# Altium integrated library Weidmueller_OMNIMATE_Signal.IntLib: 2550 symbols (part 30 of 45) (continued)
## 1864130000 (continued)
OMNIMATE Signal - series BC/SC 3.81; PartNumber: 1864130000; Manufacturer: Weidmueller; Short_text_for_material: SC-SMT 3.81/08/180LF 1.5SN BK BX; Side_termination_characteristic: Solder flange; Mounting_onto_the_PCB: Reflow solder connection; Pitch_mm: 3.81 mm; Pitch_inch: 0.15 inch; No_of_poles: 8; Outgoing_elbow: 180°; Solder_pin_length_mm: 1.5 mm; Contact_surface: tinned; Insulating_material: LCP GF; UL_94_flammability_rating: V-0; Rated_voltage_for_surge_voltage_class_pollution_degree_II_2: 320 V; Rated_current_min_no_of_poles_TU_20_deg_C: 17.5 A; Rated_voltage_use_group_B_UL_1059: 300 V; Rated_current_use_group_B_UL_1059: 10 A; PackageReference: SC_SMT_3_81_180LF_08; Colour: Black; Packaging: Box; Qty: 50 PCS; Revision: V1; ComponentLink1Description: Manufacturer URL; ComponentLink1URL: http://www.weidmueller.com/; ComponentLink2Description: URL Link1; ComponentLink2URL: http://catalog.weidmueller.com/catalog/Start.do?localeId=en&ObjectID=1864130000
footprint SC_SMT_3_81_180LF_08 (OMNIMATE Signal - Serie BC/SC 3.81  SC-SMT 3.81/08/180LF 3.2)
pins: A1, A2, A3, A4, A5, A6, A7, A8

## 1864130000_Single
designator J?
OMNIMATE Signal - series BC/SC 3.81; PartNumber: 1864130000; Manufacturer: Weidmueller; Short_text_for_material: SC-SMT 3.81/08/180LF 1.5SN BK BX; Side_termination_characteristic: Solder flange; Mounting_onto_the_PCB: Reflow solder connection; Pitch_mm: 3.81 mm; Pitch_inch: 0.15 inch; No_of_poles: 8; Outgoing_elbow: 180°; Solder_pin_length_mm: 1.5 mm; Contact_surface: tinned; Insulating_material: LCP GF; UL_94_flammability_rating: V-0; Rated_voltage_for_surge_voltage_class_pollution_degree_II_2: 320 V; Rated_current_min_no_of_poles_TU_20_deg_C: 17.5 A; Rated_voltage_use_group_B_UL_1059: 300 V; Rated_current_use_group_B_UL_1059: 10 A; PackageReference: SC_SMT_3_81_180LF_08; Colour: Black; Packaging: Box; Qty: 50 PCS; Revision: V1; ComponentLink1Description: Manufacturer URL; ComponentLink1URL: http://www.weidmueller.com/; ComponentLink2Description: URL Link1; ComponentLink2URL: http://catalog.weidmueller.com/catalog/Start.do?localeId=en&ObjectID=1864130000
footprint SC_SMT_3_81_180LF_08 (OMNIMATE Signal - Serie BC/SC 3.81  SC-SMT 3.81/08/180LF 3.2)
part A pins: A1
part B pins: A2
part C pins: A3
part D pins: A4
part E pins: A5
part F pins: A6
part G pins: A7
part H pins: A8

## 1864220000
designator J?
OMNIMATE Signal - series BC/SC 3.81; PartNumber: 1864220000; Manufacturer: Weidmueller; Short_text_for_material: SC-SMT 3.81/02/180LF 1.5SN BK RL; Side_termination_characteristic: Solder flange; Mounting_onto_the_PCB: Reflow solder connection; Pitch_mm: 3.81 mm; Pitch_inch: 0.15 inch; No_of_poles: 2; Outgoing_elbow: 180°; Solder_pin_length_mm: 1.5 mm; Contact_surface: tinned; Insulating_material: LCP GF; UL_94_flammability_rating: V-0; Rated_voltage_for_surge_voltage_class_pollution_degree_II_2: 320 V; Rated_current_min_no_of_poles_TU_20_deg_C: 17.5 A; Rated_voltage_use_group_B_UL_1059: 300 V; Rated_current_use_group_B_UL_1059: 10 A; PackageReference: SC_SMT_3_81_180LF_02; Colour: Black; Packaging: Tape; Qty: 300 PCS; Revision: V1; ComponentLink1Description: Manufacturer URL; ComponentLink1URL: http://www.weidmueller.com/; ComponentLink2Description: URL Link1; ComponentLink2URL: http://catalog.weidmueller.com/catalog/Start.do?localeId=en&ObjectID=1864220000
footprint SC_SMT_3_81_180LF_02 (OMNIMATE Signal - Serie BC/SC 3.81  SC-SMT 3.81/02/180LF 3.2)
pins: A1, A2

## 1864220000_Single
designator J?
OMNIMATE Signal - series BC/SC 3.81; PartNumber: 1864220000; Manufacturer: Weidmueller; Short_text_for_material: SC-SMT 3.81/02/180LF 1.5SN BK RL; Side_termination_characteristic: Solder flange; Mounting_onto_the_PCB: Reflow solder connection; Pitch_mm: 3.81 mm; Pitch_inch: 0.15 inch; No_of_poles: 2; Outgoing_elbow: 180°; Solder_pin_length_mm: 1.5 mm; Contact_surface: tinned; Insulating_material: LCP GF; UL_94_flammability_rating: V-0; Rated_voltage_for_surge_voltage_class_pollution_degree_II_2: 320 V; Rated_current_min_no_of_poles_TU_20_deg_C: 17.5 A; Rated_voltage_use_group_B_UL_1059: 300 V; Rated_current_use_group_B_UL_1059: 10 A; PackageReference: SC_SMT_3_81_180LF_02; Colour: Black; Packaging: Tape; Qty: 300 PCS; Revision: V1; ComponentLink1Description: Manufacturer URL; ComponentLink1URL: http://www.weidmueller.com/; ComponentLink2Description: URL Link1; ComponentLink2URL: http://catalog.weidmueller.com/catalog/Start.do?localeId=en&ObjectID=1864220000
footprint SC_SMT_3_81_180LF_02 (OMNIMATE Signal - Serie BC/SC 3.81  SC-SMT 3.81/02/180LF 3.2)
part A pins: A1
part B pins: A2

## 1864230000
designator J?
OMNIMATE Signal - series BC/SC 3.81; PartNumber: 1864230000; Manufacturer: Weidmueller; Short_text_for_material: SC-SMT 3.81/03/180LF 1.5SN BK RL; Side_termination_characteristic: Solder flange; Mounting_onto_the_PCB: Reflow solder connection; Pitch_mm: 3.81 mm; Pitch_inch: 0.15 inch; No_of_poles: 3; Outgoing_elbow: 180°; Solder_pin_length_mm: 1.5 mm; Contact_surface: tinned; Insulating_material: LCP GF; UL_94_flammability_rating: V-0; Rated_voltage_for_surge_voltage_class_pollution_degree_II_2: 320 V; Rated_current_min_no_of_poles_TU_20_deg_C: 17.5 A; Rated_voltage_use_group_B_UL_1059: 300 V; Rated_current_use_group_B_UL_1059: 10 A; PackageReference: SC_SMT_3_81_180LF_03; Colour: Black; Packaging: Tape; Qty: 300 PCS; Revision: V1; ComponentLink1Description: Manufacturer URL; ComponentLink1URL: http://www.weidmueller.com/; ComponentLink2Description: URL Link1; ComponentLink2URL: http://catalog.weidmueller.com/catalog/Start.do?localeId=en&ObjectID=1864230000
footprint SC_SMT_3_81_180LF_03 (OMNIMATE Signal - Serie BC/SC 3.81  SC-SMT 3.81/03/180LF 3.2)
pins: A1, A2, A3

## 1864230000_Single
designator J?
OMNIMATE Signal - series BC/SC 3.81; PartNumber: 1864230000; Manufacturer: Weidmueller; Short_text_for_material: SC-SMT 3.81/03/180LF 1.5SN BK RL; Side_termination_characteristic: Solder flange; Mounting_onto_the_PCB: Reflow solder connection; Pitch_mm: 3.81 mm; Pitch_inch: 0.15 inch; No_of_poles: 3; Outgoing_elbow: 180°; Solder_pin_length_mm: 1.5 mm; Contact_surface: tinned; Insulating_material: LCP GF; UL_94_flammability_rating: V-0; Rated_voltage_for_surge_voltage_class_pollution_degree_II_2: 320 V; Rated_current_min_no_of_poles_TU_20_deg_C: 17.5 A; Rated_voltage_use_group_B_UL_1059: 300 V; Rated_current_use_group_B_UL_1059: 10 A; PackageReference: SC_SMT_3_81_180LF_03; Colour: Black; Packaging: Tape; Qty: 300 PCS; Revision: V1; ComponentLink1Description: Manufacturer URL; ComponentLink1URL: http://www.weidmueller.com/; ComponentLink2Description: URL Link1; ComponentLink2URL: http://catalog.weidmueller.com/catalog/Start.do?localeId=en&ObjectID=1864230000
footprint SC_SMT_3_81_180LF_03 (OMNIMATE Signal - Serie BC/SC 3.81  SC-SMT 3.81/03/180LF 3.2)
part A pins: A1
part B pins: A2
part C pins: A3

## 1864240000
designator J?
OMNIMATE Signal - series BC/SC 3.81; PartNumber: 1864240000; Manufacturer: Weidmueller; Short_text_for_material: SC-SMT 3.81/04/180LF 1.5SN BK RL; Side_termination_characteristic: Solder flange; Mounting_onto_the_PCB: Reflow solder connection; Pitch_mm: 3.81 mm; Pitch_inch: 0.15 inch; No_of_poles: 4; Outgoing_elbow: 180°; Solder_pin_length_mm: 1.5 mm; Contact_surface: tinned; Insulating_material: LCP GF; UL_94_flammability_rating: V-0; Rated_voltage_for_surge_voltage_class_pollution_degree_II_2: 320 V; Rated_current_min_no_of_poles_TU_20_deg_C: 17.5 A; Rated_voltage_use_group_B_UL_1059: 300 V; Rated_current_use_group_B_UL_1059: 10 A; PackageReference: SC_SMT_3_81_180LF_04; Colour: Black; Packaging: Tape; Qty: 300 PCS; Revision: V1; ComponentLink1Description: Manufacturer URL; ComponentLink1URL: http://www.weidmueller.com/; ComponentLink2Description: URL Link1; ComponentLink2URL: http://catalog.weidmueller.com/catalog/Start.do?localeId=en&ObjectID=1864240000
footprint SC_SMT_3_81_180LF_04 (OMNIMATE Signal - Serie BC/SC 3.81  SC-SMT 3.81/04/180LF 3.2)
pins: A1, A2, A3, A4

## 1864240000_Single
designator J?
OMNIMATE Signal - series BC/SC 3.81; PartNumber: 1864240000; Manufacturer: Weidmueller; Short_text_for_material: SC-SMT 3.81/04/180LF 1.5SN BK RL; Side_termination_characteristic: Solder flange; Mounting_onto_the_PCB: Reflow solder connection; Pitch_mm: 3.81 mm; Pitch_inch: 0.15 inch; No_of_poles: 4; Outgoing_elbow: 180°; Solder_pin_length_mm: 1.5 mm; Contact_surface: tinned; Insulating_material: LCP GF; UL_94_flammability_rating: V-0; Rated_voltage_for_surge_voltage_class_pollution_degree_II_2: 320 V; Rated_current_min_no_of_poles_TU_20_deg_C: 17.5 A; Rated_voltage_use_group_B_UL_1059: 300 V; Rated_current_use_group_B_UL_1059: 10 A; PackageReference: SC_SMT_3_81_180LF_04; Colour: Black; Packaging: Tape; Qty: 300 PCS; Revision: V1; ComponentLink1Description: Manufacturer URL; ComponentLink1URL: http://www.weidmueller.com/; ComponentLink2Description: URL Link1; ComponentLink2URL: http://catalog.weidmueller.com/catalog/Start.do?localeId=en&ObjectID=1864240000
footprint SC_SMT_3_81_180LF_04 (OMNIMATE Signal - Serie BC/SC 3.81  SC-SMT 3.81/04/180LF 3.2)
part A pins: A1
part B pins: A2
part C pins: A3
part D pins: A4

## 1864280000
designator J?
OMNIMATE Signal - series BC/SC 3.81; PartNumber: 1864280000; Manufacturer: Weidmueller; Short_text_for_material: SC-SMT 3.81/08/180LF 1.5SN BK RL; Side_termination_characteristic: Solder flange; Mounting_onto_the_PCB: Reflow solder connection; Pitch_mm: 3.81 mm; Pitch_inch: 0.15 inch; No_of_poles: 8; Outgoing_elbow: 180°; Solder_pin_length_mm: 1.5 mm; Contact_surface: tinned; Insulating_material: LCP GF; UL_94_flammability_rating: V-0; Rated_voltage_for_surge_voltage_class_pollution_degree_II_2: 320 V; Rated_current_min_no_of_poles_TU_20_deg_C: 17.5 A; Rated_voltage_use_group_B_UL_1059: 300 V; Rated_current_use_group_B_UL_1059: 10 A; PackageReference: SC_SMT_3_81_180LF_08; Colour: Black; Packaging: Tape; Qty: 300 PCS; Revision: V1; ComponentLink1Description: Manufacturer URL; ComponentLink1URL: http://www.weidmueller.com/; ComponentLink2Description: URL Link1; ComponentLink2URL: http://catalog.weidmueller.com/catalog/Start.do?localeId=en&ObjectID=1864280000
footprint SC_SMT_3_81_180LF_08 (OMNIMATE Signal - Serie BC/SC 3.81  SC-SMT 3.81/08/180LF 3.2)
pins: A1, A2, A3, A4, A5, A6, A7, A8

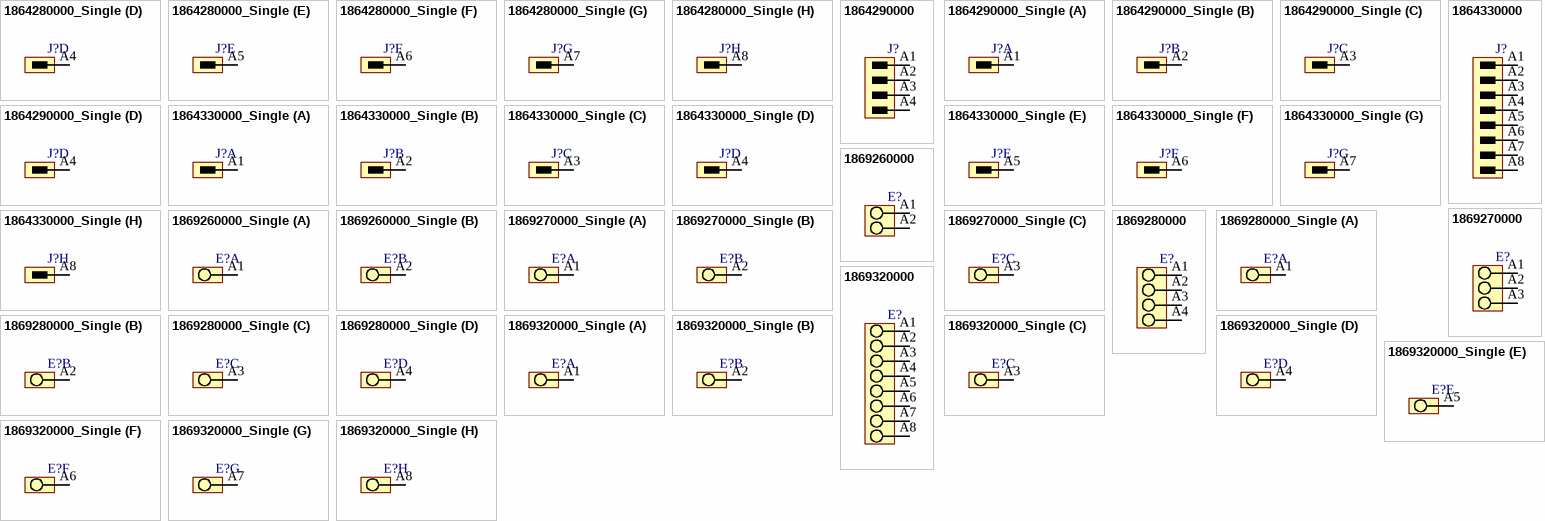
[diagram p151: symbols 1864280000_Single to 1869320000_Single]

## 1864280000_Single
designator J?
OMNIMATE Signal - series BC/SC 3.81; PartNumber: 1864280000; Manufacturer: Weidmueller; Short_text_for_material: SC-SMT 3.81/08/180LF 1.5SN BK RL; Side_termination_characteristic: Solder flange; Mounting_onto_the_PCB: Reflow solder connection; Pitch_mm: 3.81 mm; Pitch_inch: 0.15 inch; No_of_poles: 8; Outgoing_elbow: 180°; Solder_pin_length_mm: 1.5 mm; Contact_surface: tinned; Insulating_material: LCP GF; UL_94_flammability_rating: V-0; Rated_voltage_for_surge_voltage_class_pollution_degree_II_2: 320 V; Rated_current_min_no_of_poles_TU_20_deg_C: 17.5 A; Rated_voltage_use_group_B_UL_1059: 300 V; Rated_current_use_group_B_UL_1059: 10 A; PackageReference: SC_SMT_3_81_180LF_08; Colour: Black; Packaging: Tape; Qty: 300 PCS; Revision: V1; ComponentLink1Description: Manufacturer URL; ComponentLink1URL: http://www.weidmueller.com/; ComponentLink2Description: URL Link1; ComponentLink2URL: http://catalog.weidmueller.com/catalog/Start.do?localeId=en&ObjectID=1864280000
footprint SC_SMT_3_81_180LF_08 (OMNIMATE Signal - Serie BC/SC 3.81  SC-SMT 3.81/08/180LF 3.2)
part A pins: A1
part B pins: A2
part C pins: A3
part D pins: A4
part E pins: A5
part F pins: A6
part G pins: A7
part H pins: A8

## 1864290000
designator J?
OMNIMATE Signal - series BC/SC 3.81; PartNumber: 1864290000; Manufacturer: Weidmueller; Short_text_for_material: SC-SMT 3.81/04/180G 1.5SN BK RL; Side_termination_characteristic: closed side; Mounting_onto_the_PCB: Reflow solder connection; Pitch_mm: 3.81 mm; Pitch_inch: 0.15 inch; No_of_poles: 4; Outgoing_elbow: 180°; Solder_pin_length_mm: 1.5 mm; Contact_surface: tinned; Insulating_material: LCP GF; UL_94_flammability_rating: V-0; Rated_voltage_for_surge_voltage_class_pollution_degree_II_2: 320 V; Rated_current_min_no_of_poles_TU_20_deg_C: 17.5 A; Rated_voltage_use_group_B_UL_1059: 300 V; Rated_current_use_group_B_UL_1059: 10 A; PackageReference: SC_SMT_3_81_180G_04; Colour: Black; Packaging: Tape; Qty: 300 PCS; Revision: V1; ComponentLink1Description: Manufacturer URL; ComponentLink1URL: http://www.weidmueller.com/; ComponentLink2Description: URL Link1; ComponentLink2URL: http://catalog.weidmueller.com/catalog/Start.do?localeId=en&ObjectID=1864290000
footprint SC_SMT_3_81_180G_04 (OMNIMATE Signal - Serie BC/SC 3.81  SC-SMT 3.81/04/180G 3.2)
pins: A1, A2, A3, A4

## 1864290000_Single
designator J?
OMNIMATE Signal - series BC/SC 3.81; PartNumber: 1864290000; Manufacturer: Weidmueller; Short_text_for_material: SC-SMT 3.81/04/180G 1.5SN BK RL; Side_termination_characteristic: closed side; Mounting_onto_the_PCB: Reflow solder connection; Pitch_mm: 3.81 mm; Pitch_inch: 0.15 inch; No_of_poles: 4; Outgoing_elbow: 180°; Solder_pin_length_mm: 1.5 mm; Contact_surface: tinned; Insulating_material: LCP GF; UL_94_flammability_rating: V-0; Rated_voltage_for_surge_voltage_class_pollution_degree_II_2: 320 V; Rated_current_min_no_of_poles_TU_20_deg_C: 17.5 A; Rated_voltage_use_group_B_UL_1059: 300 V; Rated_current_use_group_B_UL_1059: 10 A; PackageReference: SC_SMT_3_81_180G_04; Colour: Black; Packaging: Tape; Qty: 300 PCS; Revision: V1; ComponentLink1Description: Manufacturer URL; ComponentLink1URL: http://www.weidmueller.com/; ComponentLink2Description: URL Link1; ComponentLink2URL: http://catalog.weidmueller.com/catalog/Start.do?localeId=en&ObjectID=1864290000
footprint SC_SMT_3_81_180G_04 (OMNIMATE Signal - Serie BC/SC 3.81  SC-SMT 3.81/04/180G 3.2)
part A pins: A1
part B pins: A2
part C pins: A3
part D pins: A4

## 1864330000
designator J?
OMNIMATE Signal - series BC/SC 3.81; PartNumber: 1864330000; Manufacturer: Weidmueller; Short_text_for_material: SC-SMT 3.81/08/180G 1.5SN BK RL; Side_termination_characteristic: closed side; Mounting_onto_the_PCB: Reflow solder connection; Pitch_mm: 3.81 mm; Pitch_inch: 0.15 inch; No_of_poles: 8; Outgoing_elbow: 180°; Solder_pin_length_mm: 1.5 mm; Contact_surface: tinned; Insulating_material: LCP GF; UL_94_flammability_rating: V-0; Rated_voltage_for_surge_voltage_class_pollution_degree_II_2: 320 V; Rated_current_min_no_of_poles_TU_20_deg_C: 17.5 A; Rated_voltage_use_group_B_UL_1059: 300 V; Rated_current_use_group_B_UL_1059: 10 A; PackageReference: SC_SMT_3_81_180G_08; Colour: Black; Packaging: Tape; Qty: 300 PCS; Revision: V1; ComponentLink1Description: Manufacturer URL; ComponentLink1URL: http://www.weidmueller.com/; ComponentLink2Description: URL Link1; ComponentLink2URL: http://catalog.weidmueller.com/catalog/Start.do?localeId=en&ObjectID=1864330000
footprint SC_SMT_3_81_180G_08 (OMNIMATE Signal - Serie BC/SC 3.81  SC-SMT 3.81/08/180G 3.2)
pins: A1, A2, A3, A4, A5, A6, A7, A8

## 1864330000_Single
designator J?
OMNIMATE Signal - series BC/SC 3.81; PartNumber: 1864330000; Manufacturer: Weidmueller; Short_text_for_material: SC-SMT 3.81/08/180G 1.5SN BK RL; Side_termination_characteristic: closed side; Mounting_onto_the_PCB: Reflow solder connection; Pitch_mm: 3.81 mm; Pitch_inch: 0.15 inch; No_of_poles: 8; Outgoing_elbow: 180°; Solder_pin_length_mm: 1.5 mm; Contact_surface: tinned; Insulating_material: LCP GF; UL_94_flammability_rating: V-0; Rated_voltage_for_surge_voltage_class_pollution_degree_II_2: 320 V; Rated_current_min_no_of_poles_TU_20_deg_C: 17.5 A; Rated_voltage_use_group_B_UL_1059: 300 V; Rated_current_use_group_B_UL_1059: 10 A; PackageReference: SC_SMT_3_81_180G_08; Colour: Black; Packaging: Tape; Qty: 300 PCS; Revision: V1; ComponentLink1Description: Manufacturer URL; ComponentLink1URL: http://www.weidmueller.com/; ComponentLink2Description: URL Link1; ComponentLink2URL: http://catalog.weidmueller.com/catalog/Start.do?localeId=en&ObjectID=1864330000
footprint SC_SMT_3_81_180G_08 (OMNIMATE Signal - Serie BC/SC 3.81  SC-SMT 3.81/08/180G 3.2)
part A pins: A1
part B pins: A2
part C pins: A3
part D pins: A4
part E pins: A5
part F pins: A6
part G pins: A7
part H pins: A8

## 1869260000
designator E?
OMNIMATE Signal - series LSF; PartNumber: 1869260000; Manufacturer: Weidmueller; Short_text_for_material: LSF-SMT 7.62/02/90 1.5SN BK TU; Side_termination_characteristic: closed side; Mounting_onto_the_PCB: Reflow solder connection; Pitch_mm: 7,62 mm; Pitch_inch: 0,3 inch; No_of_poles: 2; Solder_pin_length_mm: 1,5 mm; Contact_material: Cu-Leg; Contact_surface: tinned; Insulating_material: LCP GF; UL_94_flammability_rating: V-0; Rated_voltage_for_surge_voltage_class_pollution_degree_II_2: 800 V; Rated_current_min_no_of_poles_TU_20_deg_C: 17,5 A; Solid_min_H05_07_V_U: 0,2 mm²; Solid_max_H05_07_V_U: 1,5 mm²; Rated_voltage_use_group_B_UL_1059: 300 V; Rated_current_use_group_B_UL_1059: 12 A; Wire_cross_section_AWG_min_UL_1059: AWG 24; Wire_cross_section_AWG_max_UL_1059: AWG 16; PackageReference: LSF_SMT_7_62_90_02; Colour: Black; Packaging: Tube; Qty: 46 PCS; Revision: V1; ComponentLink1Description: Manufacturer URL; ComponentLink1URL: http://www.weidmueller.com/; ComponentLink2Description: URL Link1; ComponentLink2URL: http://catalog.weidmueller.com/catalog/Start.do?localeId=en&ObjectID=1869260000
footprint LSF_SMT_7_62_90_02 (OMNIMATE Signal - Serie LSF  LSF-SMT 7.62/02/90 3.5)
pins: A1, A2
1 alternate drawing of the same symbol

## 1869260000_Single
designator E?
OMNIMATE Signal - series LSF; PartNumber: 1869260000; Manufacturer: Weidmueller; Short_text_for_material: LSF-SMT 7.62/02/90 1.5SN BK TU; Side_termination_characteristic: closed side; Mounting_onto_the_PCB: Reflow solder connection; Pitch_mm: 7,62 mm; Pitch_inch: 0,3 inch; No_of_poles: 2; Solder_pin_length_mm: 1,5 mm; Contact_material: Cu-Leg; Contact_surface: tinned; Insulating_material: LCP GF; UL_94_flammability_rating: V-0; Rated_voltage_for_surge_voltage_class_pollution_degree_II_2: 800 V; Rated_current_min_no_of_poles_TU_20_deg_C: 17,5 A; Solid_min_H05_07_V_U: 0,2 mm²; Solid_max_H05_07_V_U: 1,5 mm²; Rated_voltage_use_group_B_UL_1059: 300 V; Rated_current_use_group_B_UL_1059: 12 A; Wire_cross_section_AWG_min_UL_1059: AWG 24; Wire_cross_section_AWG_max_UL_1059: AWG 16; PackageReference: LSF_SMT_7_62_90_02; Colour: Black; Packaging: Tube; Qty: 46 PCS; Revision: V1; ComponentLink1Description: Manufacturer URL; ComponentLink1URL: http://www.weidmueller.com/; ComponentLink2Description: URL Link1; ComponentLink2URL: http://catalog.weidmueller.com/catalog/Start.do?localeId=en&ObjectID=1869260000
footprint LSF_SMT_7_62_90_02 (OMNIMATE Signal - Serie LSF  LSF-SMT 7.62/02/90 3.5)
part A pins: A1
part B pins: A2
1 alternate drawing of the same symbol

## 1869270000
designator E?
OMNIMATE Signal - series LSF; PartNumber: 1869270000; Manufacturer: Weidmueller; Short_text_for_material: LSF-SMT 7.62/03/90 1.5SN BK TU; Side_termination_characteristic: closed side; Mounting_onto_the_PCB: Reflow solder connection; Pitch_mm: 7,62 mm; Pitch_inch: 0,3 inch; No_of_poles: 3; Solder_pin_length_mm: 1,5 mm; Contact_material: Cu-Leg; Contact_surface: tinned; Insulating_material: LCP GF; UL_94_flammability_rating: V-0; Rated_voltage_for_surge_voltage_class_pollution_degree_II_2: 800 V; Rated_current_min_no_of_poles_TU_20_deg_C: 17,5 A; Solid_min_H05_07_V_U: 0,2 mm²; Solid_max_H05_07_V_U: 1,5 mm²; Rated_voltage_use_group_B_UL_1059: 300 V; Rated_current_use_group_B_UL_1059: 12 A; Wire_cross_section_AWG_min_UL_1059: AWG 24; Wire_cross_section_AWG_max_UL_1059: AWG 16; PackageReference: LSF_SMT_7_62_90_03; Colour: Black; Packaging: Tube; Qty: 28 PCS; Revision: V1; ComponentLink1Description: Manufacturer URL; ComponentLink1URL: http://www.weidmueller.com/; ComponentLink2Description: URL Link1; ComponentLink2URL: http://catalog.weidmueller.com/catalog/Start.do?localeId=en&ObjectID=1869270000
footprint LSF_SMT_7_62_90_03 (OMNIMATE Signal - Serie LSF  LSF-SMT 7.62/03/90 3.5)
pins: A1, A2, A3
1 alternate drawing of the same symbol

## 1869270000_Single
designator E?
OMNIMATE Signal - series LSF; PartNumber: 1869270000; Manufacturer: Weidmueller; Short_text_for_material: LSF-SMT 7.62/03/90 1.5SN BK TU; Side_termination_characteristic: closed side; Mounting_onto_the_PCB: Reflow solder connection; Pitch_mm: 7,62 mm; Pitch_inch: 0,3 inch; No_of_poles: 3; Solder_pin_length_mm: 1,5 mm; Contact_material: Cu-Leg; Contact_surface: tinned; Insulating_material: LCP GF; UL_94_flammability_rating: V-0; Rated_voltage_for_surge_voltage_class_pollution_degree_II_2: 800 V; Rated_current_min_no_of_poles_TU_20_deg_C: 17,5 A; Solid_min_H05_07_V_U: 0,2 mm²; Solid_max_H05_07_V_U: 1,5 mm²; Rated_voltage_use_group_B_UL_1059: 300 V; Rated_current_use_group_B_UL_1059: 12 A; Wire_cross_section_AWG_min_UL_1059: AWG 24; Wire_cross_section_AWG_max_UL_1059: AWG 16; PackageReference: LSF_SMT_7_62_90_03; Colour: Black; Packaging: Tube; Qty: 28 PCS; Revision: V1; ComponentLink1Description: Manufacturer URL; ComponentLink1URL: http://www.weidmueller.com/; ComponentLink2Description: URL Link1; ComponentLink2URL: http://catalog.weidmueller.com/catalog/Start.do?localeId=en&ObjectID=1869270000
footprint LSF_SMT_7_62_90_03 (OMNIMATE Signal - Serie LSF  LSF-SMT 7.62/03/90 3.5)
part A pins: A1
part B pins: A2
part C pins: A3
1 alternate drawing of the same symbol

## 1869280000
designator E?
OMNIMATE Signal - series LSF; PartNumber: 1869280000; Manufacturer: Weidmueller; Short_text_for_material: LSF-SMT 7.62/04/90 1.5SN BK TU; Side_termination_characteristic: closed side; Mounting_onto_the_PCB: Reflow solder connection; Pitch_mm: 7,62 mm; Pitch_inch: 0,3 inch; No_of_poles: 4; Solder_pin_length_mm: 1,5 mm; Contact_material: Cu-Leg; Contact_surface: tinned; Insulating_material: LCP GF; UL_94_flammability_rating: V-0; Rated_voltage_for_surge_voltage_class_pollution_degree_II_2: 800 V; Rated_current_min_no_of_poles_TU_20_deg_C: 17,5 A; Solid_min_H05_07_V_U: 0,2 mm²; Solid_max_H05_07_V_U: 1,5 mm²; Rated_voltage_use_group_B_UL_1059: 300 V; Rated_current_use_group_B_UL_1059: 12 A; Wire_cross_section_AWG_min_UL_1059: AWG 24; Wire_cross_section_AWG_max_UL_1059: AWG 16; PackageReference: LSF_SMT_7_62_90_04; Colour: Black; Packaging: Tube; Qty: 20 PCS; Revision: V1; ComponentLink1Description: Manufacturer URL; ComponentLink1URL: http://www.weidmueller.com/; ComponentLink2Description: URL Link1; ComponentLink2URL: http://catalog.weidmueller.com/catalog/Start.do?localeId=en&ObjectID=1869280000
footprint LSF_SMT_7_62_90_04 (OMNIMATE Signal - Serie LSF  LSF-SMT 7.62/04/90 3.5)
pins: A1, A2, A3, A4
1 alternate drawing of the same symbol

## 1869280000_Single
designator E?
OMNIMATE Signal - series LSF; PartNumber: 1869280000; Manufacturer: Weidmueller; Short_text_for_material: LSF-SMT 7.62/04/90 1.5SN BK TU; Side_termination_characteristic: closed side; Mounting_onto_the_PCB: Reflow solder connection; Pitch_mm: 7,62 mm; Pitch_inch: 0,3 inch; No_of_poles: 4; Solder_pin_length_mm: 1,5 mm; Contact_material: Cu-Leg; Contact_surface: tinned; Insulating_material: LCP GF; UL_94_flammability_rating: V-0; Rated_voltage_for_surge_voltage_class_pollution_degree_II_2: 800 V; Rated_current_min_no_of_poles_TU_20_deg_C: 17,5 A; Solid_min_H05_07_V_U: 0,2 mm²; Solid_max_H05_07_V_U: 1,5 mm²; Rated_voltage_use_group_B_UL_1059: 300 V; Rated_current_use_group_B_UL_1059: 12 A; Wire_cross_section_AWG_min_UL_1059: AWG 24; Wire_cross_section_AWG_max_UL_1059: AWG 16; PackageReference: LSF_SMT_7_62_90_04; Colour: Black; Packaging: Tube; Qty: 20 PCS; Revision: V1; ComponentLink1Description: Manufacturer URL; ComponentLink1URL: http://www.weidmueller.com/; ComponentLink2Description: URL Link1; ComponentLink2URL: http://catalog.weidmueller.com/catalog/Start.do?localeId=en&ObjectID=1869280000
footprint LSF_SMT_7_62_90_04 (OMNIMATE Signal - Serie LSF  LSF-SMT 7.62/04/90 3.5)
part A pins: A1
part B pins: A2
part C pins: A3
part D pins: A4
1 alternate drawing of the same symbol

## 1869320000
designator E?
OMNIMATE Signal - series LSF; PartNumber: 1869320000; Manufacturer: Weidmueller; Short_text_for_material: LSF-SMT 7.62/08/90 1.5SN BK TU; Side_termination_characteristic: closed side; Mounting_onto_the_PCB: Reflow solder connection; Pitch_mm: 7,62 mm; Pitch_inch: 0,3 inch; No_of_poles: 8; Solder_pin_length_mm: 1,5 mm; Contact_material: Cu-Leg; Contact_surface: tinned; Insulating_material: LCP GF; UL_94_flammability_rating: V-0; Rated_voltage_for_surge_voltage_class_pollution_degree_II_2: 800 V; Rated_current_min_no_of_poles_TU_20_deg_C: 17,5 A; Solid_min_H05_07_V_U: 0,2 mm²; Solid_max_H05_07_V_U: 1,5 mm²; Rated_voltage_use_group_B_UL_1059: 300 V; Rated_current_use_group_B_UL_1059: 12 A; Wire_cross_section_AWG_min_UL_1059: AWG 24; Wire_cross_section_AWG_max_UL_1059: AWG 16; PackageReference: LSF_SMT_7_62_90_08; Colour: Black; Packaging: Tube; Qty: 9 PCS; Revision: V1; ComponentLink1Description: Manufacturer URL; ComponentLink1URL: http://www.weidmueller.com/; ComponentLink2Description: URL Link1; ComponentLink2URL: http://catalog.weidmueller.com/catalog/Start.do?localeId=en&ObjectID=1869320000
footprint LSF_SMT_7_62_90_08 (OMNIMATE Signal - Serie LSF  LSF-SMT 7.62/08/90 3.5)
pins: A1, A2, A3, A4, A5, A6, A7, A8
1 alternate drawing of the same symbol

## 1869320000_Single
designator E?
OMNIMATE Signal - series LSF; PartNumber: 1869320000; Manufacturer: Weidmueller; Short_text_for_material: LSF-SMT 7.62/08/90 1.5SN BK TU; Side_termination_characteristic: closed side; Mounting_onto_the_PCB: Reflow solder connection; Pitch_mm: 7,62 mm; Pitch_inch: 0,3 inch; No_of_poles: 8; Solder_pin_length_mm: 1,5 mm; Contact_material: Cu-Leg; Contact_surface: tinned; Insulating_material: LCP GF; UL_94_flammability_rating: V-0; Rated_voltage_for_surge_voltage_class_pollution_degree_II_2: 800 V; Rated_current_min_no_of_poles_TU_20_deg_C: 17,5 A; Solid_min_H05_07_V_U: 0,2 mm²; Solid_max_H05_07_V_U: 1,5 mm²; Rated_voltage_use_group_B_UL_1059: 300 V; Rated_current_use_group_B_UL_1059: 12 A; Wire_cross_section_AWG_min_UL_1059: AWG 24; Wire_cross_section_AWG_max_UL_1059: AWG 16; PackageReference: LSF_SMT_7_62_90_08; Colour: Black; Packaging: Tube; Qty: 9 PCS; Revision: V1; ComponentLink1Description: Manufacturer URL; ComponentLink1URL: http://www.weidmueller.com/; ComponentLink2Description: URL Link1; ComponentLink2URL: http://catalog.weidmueller.com/catalog/Start.do?localeId=en&ObjectID=1869320000
footprint LSF_SMT_7_62_90_08 (OMNIMATE Signal - Serie LSF  LSF-SMT 7.62/08/90 3.5)
part A pins: A1
part B pins: A2
part C pins: A3
part D pins: A4
part E pins: A5
part F pins: A6
part G pins: A7
part H pins: A8
1 alternate drawing of the same symbol

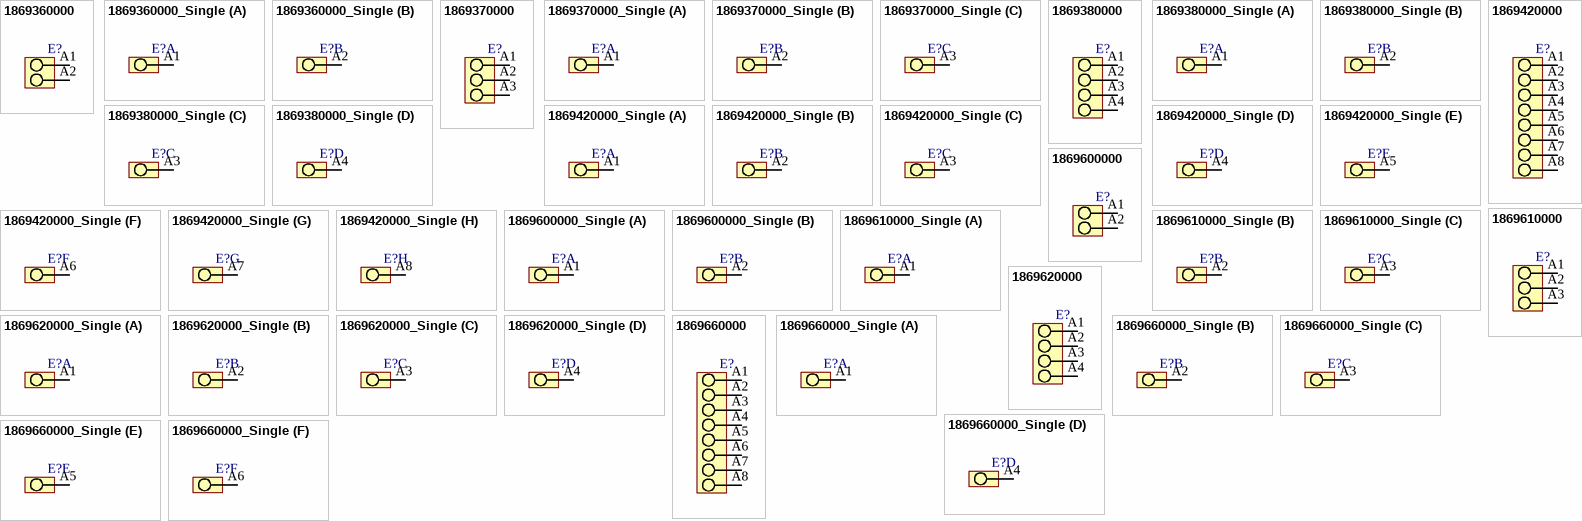
[diagram p152: symbols 1869360000 to 1869660000_Single]

## 1869360000
designator E?
OMNIMATE Signal - series LSF; PartNumber: 1869360000; Manufacturer: Weidmueller; Short_text_for_material: LSF-SMT 3.81/02/90 1.5SN BK TU; Side_termination_characteristic: closed side; Mounting_onto_the_PCB: Reflow solder connection; Pitch_mm: 3,81 mm; Pitch_inch: 0,15 inch; No_of_poles: 2; Solder_pin_length_mm: 1,5 mm; Contact_material: Cu-Leg; Contact_surface: tinned; Insulating_material: LCP GF; UL_94_flammability_rating: V-0; Rated_voltage_for_surge_voltage_class_pollution_degree_II_2: 320 V; Rated_current_min_no_of_poles_TU_20_deg_C: 17,5 A; Solid_min_H05_07_V_U: 0,2 mm²; Solid_max_H05_07_V_U: 1,5 mm²; Rated_voltage_use_group_B_UL_1059: 300 V; Rated_current_use_group_B_UL_1059: 12 A; Wire_cross_section_AWG_min_UL_1059: AWG 24; Wire_cross_section_AWG_max_UL_1059: AWG 16; PackageReference: LSF_SMT_3_81_90_02; Colour: Black; Packaging: Tube; Qty: 69 PCS; Revision: V1; ComponentLink1Description: Manufacturer URL; ComponentLink1URL: http://www.weidmueller.com/; ComponentLink2Description: URL Link1; ComponentLink2URL: http://catalog.weidmueller.com/catalog/Start.do?localeId=en&ObjectID=1869360000
footprint LSF_SMT_3_81_90_02 (OMNIMATE Signal - Serie LSF  LSF-SMT 3.81/02/90 3.5)
pins: A1, A2
1 alternate drawing of the same symbol

## 1869360000_Single
designator E?
OMNIMATE Signal - series LSF; PartNumber: 1869360000; Manufacturer: Weidmueller; Short_text_for_material: LSF-SMT 3.81/02/90 1.5SN BK TU; Side_termination_characteristic: closed side; Mounting_onto_the_PCB: Reflow solder connection; Pitch_mm: 3,81 mm; Pitch_inch: 0,15 inch; No_of_poles: 2; Solder_pin_length_mm: 1,5 mm; Contact_material: Cu-Leg; Contact_surface: tinned; Insulating_material: LCP GF; UL_94_flammability_rating: V-0; Rated_voltage_for_surge_voltage_class_pollution_degree_II_2: 320 V; Rated_current_min_no_of_poles_TU_20_deg_C: 17,5 A; Solid_min_H05_07_V_U: 0,2 mm²; Solid_max_H05_07_V_U: 1,5 mm²; Rated_voltage_use_group_B_UL_1059: 300 V; Rated_current_use_group_B_UL_1059: 12 A; Wire_cross_section_AWG_min_UL_1059: AWG 24; Wire_cross_section_AWG_max_UL_1059: AWG 16; PackageReference: LSF_SMT_3_81_90_02; Colour: Black; Packaging: Tube; Qty: 69 PCS; Revision: V1; ComponentLink1Description: Manufacturer URL; ComponentLink1URL: http://www.weidmueller.com/; ComponentLink2Description: URL Link1; ComponentLink2URL: http://catalog.weidmueller.com/catalog/Start.do?localeId=en&ObjectID=1869360000
footprint LSF_SMT_3_81_90_02 (OMNIMATE Signal - Serie LSF  LSF-SMT 3.81/02/90 3.5)
part A pins: A1
part B pins: A2
1 alternate drawing of the same symbol

## 1869370000
designator E?
OMNIMATE Signal - series LSF; PartNumber: 1869370000; Manufacturer: Weidmueller; Short_text_for_material: LSF-SMT 3.81/03/90 1.5SN BK TU; Side_termination_characteristic: closed side; Mounting_onto_the_PCB: Reflow solder connection; Pitch_mm: 3,81 mm; Pitch_inch: 0,15 inch; No_of_poles: 3; Solder_pin_length_mm: 1,5 mm; Contact_material: Cu-Leg; Contact_surface: tinned; Insulating_material: LCP GF; UL_94_flammability_rating: V-0; Rated_voltage_for_surge_voltage_class_pollution_degree_II_2: 320 V; Rated_current_min_no_of_poles_TU_20_deg_C: 17,5 A; Solid_min_H05_07_V_U: 0,2 mm²; Solid_max_H05_07_V_U: 1,5 mm²; Rated_voltage_use_group_B_UL_1059: 300 V; Rated_current_use_group_B_UL_1059: 12 A; Wire_cross_section_AWG_min_UL_1059: AWG 24; Wire_cross_section_AWG_max_UL_1059: AWG 16; PackageReference: LSF_SMT_3_81_90_03; Colour: Black; Packaging: Tube; Qty: 46 PCS; Revision: V1; ComponentLink1Description: Manufacturer URL; ComponentLink1URL: http://www.weidmueller.com/; ComponentLink2Description: URL Link1; ComponentLink2URL: http://catalog.weidmueller.com/catalog/Start.do?localeId=en&ObjectID=1869370000
footprint LSF_SMT_3_81_90_03 (OMNIMATE Signal - Serie LSF  LSF-SMT 3.81/03/90 3.5)
pins: A1, A2, A3
1 alternate drawing of the same symbol

## 1869370000_Single
designator E?
OMNIMATE Signal - series LSF; PartNumber: 1869370000; Manufacturer: Weidmueller; Short_text_for_material: LSF-SMT 3.81/03/90 1.5SN BK TU; Side_termination_characteristic: closed side; Mounting_onto_the_PCB: Reflow solder connection; Pitch_mm: 3,81 mm; Pitch_inch: 0,15 inch; No_of_poles: 3; Solder_pin_length_mm: 1,5 mm; Contact_material: Cu-Leg; Contact_surface: tinned; Insulating_material: LCP GF; UL_94_flammability_rating: V-0; Rated_voltage_for_surge_voltage_class_pollution_degree_II_2: 320 V; Rated_current_min_no_of_poles_TU_20_deg_C: 17,5 A; Solid_min_H05_07_V_U: 0,2 mm²; Solid_max_H05_07_V_U: 1,5 mm²; Rated_voltage_use_group_B_UL_1059: 300 V; Rated_current_use_group_B_UL_1059: 12 A; Wire_cross_section_AWG_min_UL_1059: AWG 24; Wire_cross_section_AWG_max_UL_1059: AWG 16; PackageReference: LSF_SMT_3_81_90_03; Colour: Black; Packaging: Tube; Qty: 46 PCS; Revision: V1; ComponentLink1Description: Manufacturer URL; ComponentLink1URL: http://www.weidmueller.com/; ComponentLink2Description: URL Link1; ComponentLink2URL: http://catalog.weidmueller.com/catalog/Start.do?localeId=en&ObjectID=1869370000
footprint LSF_SMT_3_81_90_03 (OMNIMATE Signal - Serie LSF  LSF-SMT 3.81/03/90 3.5)
part A pins: A1
part B pins: A2
part C pins: A3
1 alternate drawing of the same symbol

## 1869380000
designator E?
OMNIMATE Signal - series LSF; PartNumber: 1869380000; Manufacturer: Weidmueller; Short_text_for_material: LSF-SMT 3.81/04/90 1.5SN BK TU; Side_termination_characteristic: closed side; Mounting_onto_the_PCB: Reflow solder connection; Pitch_mm: 3,81 mm; Pitch_inch: 0,15 inch; No_of_poles: 4; Solder_pin_length_mm: 1,5 mm; Contact_material: Cu-Leg; Contact_surface: tinned; Insulating_material: LCP GF; UL_94_flammability_rating: V-0; Rated_voltage_for_surge_voltage_class_pollution_degree_II_2: 320 V; Rated_current_min_no_of_poles_TU_20_deg_C: 17,5 A; Solid_min_H05_07_V_U: 0,2 mm²; Solid_max_H05_07_V_U: 1,5 mm²; Rated_voltage_use_group_B_UL_1059: 300 V; Rated_current_use_group_B_UL_1059: 12 A; Wire_cross_section_AWG_min_UL_1059: AWG 24; Wire_cross_section_AWG_max_UL_1059: AWG 16; PackageReference: LSF_SMT_3_81_90_04; Colour: Black; Packaging: Tube; Qty: 35 PCS; Revision: V1; ComponentLink1Description: Manufacturer URL; ComponentLink1URL: http://www.weidmueller.com/; ComponentLink2Description: URL Link1; ComponentLink2URL: http://catalog.weidmueller.com/catalog/Start.do?localeId=en&ObjectID=1869380000
footprint LSF_SMT_3_81_90_04 (OMNIMATE Signal - Serie LSF  LSF-SMT 3.81/04/90 3.5)
pins: A1, A2, A3, A4
1 alternate drawing of the same symbol

## 1869380000_Single
designator E?
OMNIMATE Signal - series LSF; PartNumber: 1869380000; Manufacturer: Weidmueller; Short_text_for_material: LSF-SMT 3.81/04/90 1.5SN BK TU; Side_termination_characteristic: closed side; Mounting_onto_the_PCB: Reflow solder connection; Pitch_mm: 3,81 mm; Pitch_inch: 0,15 inch; No_of_poles: 4; Solder_pin_length_mm: 1,5 mm; Contact_material: Cu-Leg; Contact_surface: tinned; Insulating_material: LCP GF; UL_94_flammability_rating: V-0; Rated_voltage_for_surge_voltage_class_pollution_degree_II_2: 320 V; Rated_current_min_no_of_poles_TU_20_deg_C: 17,5 A; Solid_min_H05_07_V_U: 0,2 mm²; Solid_max_H05_07_V_U: 1,5 mm²; Rated_voltage_use_group_B_UL_1059: 300 V; Rated_current_use_group_B_UL_1059: 12 A; Wire_cross_section_AWG_min_UL_1059: AWG 24; Wire_cross_section_AWG_max_UL_1059: AWG 16; PackageReference: LSF_SMT_3_81_90_04; Colour: Black; Packaging: Tube; Qty: 35 PCS; Revision: V1; ComponentLink1Description: Manufacturer URL; ComponentLink1URL: http://www.weidmueller.com/; ComponentLink2Description: URL Link1; ComponentLink2URL: http://catalog.weidmueller.com/catalog/Start.do?localeId=en&ObjectID=1869380000
footprint LSF_SMT_3_81_90_04 (OMNIMATE Signal - Serie LSF  LSF-SMT 3.81/04/90 3.5)
part A pins: A1
part B pins: A2
part C pins: A3
part D pins: A4
1 alternate drawing of the same symbol

## 1869420000
designator E?
OMNIMATE Signal - series LSF; PartNumber: 1869420000; Manufacturer: Weidmueller; Short_text_for_material: LSF-SMT 3.81/08/90 1.5SN BK TU; Side_termination_characteristic: closed side; Mounting_onto_the_PCB: Reflow solder connection; Pitch_mm: 3,81 mm; Pitch_inch: 0,15 inch; No_of_poles: 8; Solder_pin_length_mm: 1,5 mm; Contact_material: Cu-Leg; Contact_surface: tinned; Insulating_material: LCP GF; UL_94_flammability_rating: V-0; Rated_voltage_for_surge_voltage_class_pollution_degree_II_2: 320 V; Rated_current_min_no_of_poles_TU_20_deg_C: 17,5 A; Solid_min_H05_07_V_U: 0,2 mm²; Solid_max_H05_07_V_U: 1,5 mm²; Rated_voltage_use_group_B_UL_1059: 300 V; Rated_current_use_group_B_UL_1059: 12 A; Wire_cross_section_AWG_min_UL_1059: AWG 24; Wire_cross_section_AWG_max_UL_1059: AWG 16; PackageReference: LSF_SMT_3_81_90_08; Colour: Black; Packaging: Tube; Qty: 17 PCS; Revision: V1; ComponentLink1Description: Manufacturer URL; ComponentLink1URL: http://www.weidmueller.com/; ComponentLink2Description: URL Link1; ComponentLink2URL: http://catalog.weidmueller.com/catalog/Start.do?localeId=en&ObjectID=1869420000
footprint LSF_SMT_3_81_90_08 (OMNIMATE Signal - Serie LSF  LSF-SMT 3.81/08/90 3.5)
pins: A1, A2, A3, A4, A5, A6, A7, A8
1 alternate drawing of the same symbol